# Altium schematic symbol library Analog Devices Operational Amplifiers.SchLib: 2102 symbols (part 3 of 35) (continued)
## AD813AR-14-REEL7
designator U?
3 Channel Low Power Operational Amplifier, 100 MHz BW, 250 V/us SR, Industrial, 14-pin SOIC (R-14), Reel; Generic Part Number: AD813; Manufacturer: Analog Devices; PartNumber: AD813AR-14-REEL7; Amplifiers Per Package: 3; Input Bias Current: 500nA; Input Offset Voltage: 2mV; Iq/Amp: 5.5mA; Small Signal Bandwidth: 100MHz; V Span Max: 36V; V Span Min: 2.4V; DatasheetVersion: Rev. B; PackageVersion: 060606-A; PackageReference: R-14; PackageDescription: 14-Pin Standard Small Outline Package, Body 8.65 x 3.9 mm, Pitch 1.27 mm; Supplier 1: Digi-Key; Supplier Part Number 1: AD813AR-14-REEL7-ND; Slew Rate: 250V/us; Mounting Technology: Surface Mount; Code_JEDEC: MS-012-AB; ComponentLink1Description: Manufacturer URL; ComponentLink1URL: http://www.analog.com/en/index.html; ComponentLink2Description: Datasheet; ComponentLink2URL: http://www.analog.com/static/imported-files/data_sheets/AD813.pdf; ComponentLink3Description: Package Specification; ComponentLink3URL: http://www.analog.com/static/imported-files/packages/PKG_PDF/SOIC_Narrow%20(R)/R_14.pdf
footprint ADI-R-14_N (SOIC, 14-Leads, Body 8.65x3.9mm, Pitch 1.27mm, IPC Medium Density)
footprint ADI-R-14_L (SOIC, 14-Leads, Body 8.65x3.9mm, Pitch 1.27mm, IPC High Density)
footprint ADI-R-14_M (SOIC, 14-Leads, Body 8.65x3.9mm, Pitch 1.27mm, IPC Low Density)
pins on every part: 4 VS+ (power), 11 VS- (power)
part A pins: 1 ~{DISABLE1} (in), 5 +IN 1 (in), 6 -IN 1 (in), 7 OUT 1 (hiz)
part B pins: 2 ~{DISABLE2} (in), 12 +IN 2 (in), 13 -IN 2 (in), 14 OUT 2 (hiz)
part C pins: 3 ~{DISABLE3} (in), 8 OUT 3 (hiz), 9 -IN 3 (in), 10 +IN 3 (in)

## AD813ARZ-14
designator U?
3 Channel Low Power Operational Amplifier, 100 MHz BW, 250 V/us SR, Industrial, 14-pin SOIC (R-14), Tube; Generic Part Number: AD813; Manufacturer: Analog Devices; PartNumber: AD813ARZ-14; Amplifiers Per Package: 3; Input Bias Current: 500nA; Input Offset Voltage: 2mV; Iq/Amp: 5.5mA; Small Signal Bandwidth: 100MHz; V Span Max: 36V; V Span Min: 2.4V; DatasheetVersion: Rev. B; PackageVersion: 060606-A; PackageReference: R-14; PackageDescription: 14-Pin Standard Small Outline Package, Body 8.65 x 3.9 mm, Pitch 1.27 mm; Supplier 1: Digi-Key; Supplier Part Number 1: AD813ARZ-14-ND; Slew Rate: 250V/us; Mounting Technology: Surface Mount; Code_JEDEC: MS-012-AB; ComponentLink1Description: Manufacturer URL; ComponentLink1URL: http://www.analog.com/en/index.html; ComponentLink2Description: Datasheet; ComponentLink2URL: http://www.analog.com/static/imported-files/data_sheets/AD813.pdf; ComponentLink3Description: Package Specification; ComponentLink3URL: http://www.analog.com/static/imported-files/packages/PKG_PDF/SOIC_Narrow%20(R)/R_14.pdf
footprint ADI-R-14_N (SOIC, 14-Leads, Body 8.65x3.9mm, Pitch 1.27mm, IPC Medium Density)
footprint ADI-R-14_L (SOIC, 14-Leads, Body 8.65x3.9mm, Pitch 1.27mm, IPC High Density)
footprint ADI-R-14_M (SOIC, 14-Leads, Body 8.65x3.9mm, Pitch 1.27mm, IPC Low Density)
pins on every part: 4 VS+ (power), 11 VS- (power)
part A pins: 1 ~{DISABLE1} (in), 5 +IN 1 (in), 6 -IN 1 (in), 7 OUT 1 (hiz)
part B pins: 2 ~{DISABLE2} (in), 12 +IN 2 (in), 13 -IN 2 (in), 14 OUT 2 (hiz)
part C pins: 3 ~{DISABLE3} (in), 8 OUT 3 (hiz), 9 -IN 3 (in), 10 +IN 3 (in)

## AD813ARZ-14-REEL
designator U?
3 Channel Low Power Operational Amplifier, 100 MHz BW, 250 V/us SR, Industrial, 14-pin SOIC (R-14), Reel; Generic Part Number: AD813; Manufacturer: Analog Devices; PartNumber: AD813ARZ-14-REEL; Amplifiers Per Package: 3; Input Bias Current: 500nA; Input Offset Voltage: 2mV; Iq/Amp: 5.5mA; Small Signal Bandwidth: 100MHz; V Span Max: 36V; V Span Min: 2.4V; DatasheetVersion: Rev. B; PackageVersion: 060606-A; PackageReference: R-14; PackageDescription: 14-Pin Standard Small Outline Package, Body 8.65 x 3.9 mm, Pitch 1.27 mm; Supplier 1: Digi-Key; Supplier Part Number 1: AD813ARZ-14-REEL-ND; Slew Rate: 250V/us; Mounting Technology: Surface Mount; Code_JEDEC: MS-012-AB; ComponentLink1Description: Manufacturer URL; ComponentLink1URL: http://www.analog.com/en/index.html; ComponentLink2Description: Datasheet; ComponentLink2URL: http://www.analog.com/static/imported-files/data_sheets/AD813.pdf; ComponentLink3Description: Package Specification; ComponentLink3URL: http://www.analog.com/static/imported-files/packages/PKG_PDF/SOIC_Narrow%20(R)/R_14.pdf
footprint ADI-R-14_N (SOIC, 14-Leads, Body 8.65x3.9mm, Pitch 1.27mm, IPC Medium Density)
footprint ADI-R-14_L (SOIC, 14-Leads, Body 8.65x3.9mm, Pitch 1.27mm, IPC High Density)
footprint ADI-R-14_M (SOIC, 14-Leads, Body 8.65x3.9mm, Pitch 1.27mm, IPC Low Density)
pins on every part: 4 VS+ (power), 11 VS- (power)
part A pins: 1 ~{DISABLE1} (in), 5 +IN 1 (in), 6 -IN 1 (in), 7 OUT 1 (hiz)
part B pins: 2 ~{DISABLE2} (in), 12 +IN 2 (in), 13 -IN 2 (in), 14 OUT 2 (hiz)
part C pins: 3 ~{DISABLE3} (in), 8 OUT 3 (hiz), 9 -IN 3 (in), 10 +IN 3 (in)

## AD813ARZ-14-REEL7
designator U?
3 Channel Low Power Operational Amplifier, 100 MHz BW, 250 V/us SR, Industrial, 14-pin SOIC (R-14), Reel; Generic Part Number: AD813; Manufacturer: Analog Devices; PartNumber: AD813ARZ-14-REEL7; Amplifiers Per Package: 3; Input Bias Current: 500nA; Input Offset Voltage: 2mV; Iq/Amp: 5.5mA; Small Signal Bandwidth: 100MHz; V Span Max: 36V; V Span Min: 2.4V; DatasheetVersion: Rev. B; PackageVersion: 060606-A; PackageReference: R-14; PackageDescription: 14-Pin Standard Small Outline Package, Body 8.65 x 3.9 mm, Pitch 1.27 mm; Supplier 1: Digi-Key; Supplier Part Number 1: AD813ARZ-14-REEL7-ND; Slew Rate: 250V/us; Mounting Technology: Surface Mount; Code_JEDEC: MS-012-AB; ComponentLink1Description: Manufacturer URL; ComponentLink1URL: http://www.analog.com/en/index.html; ComponentLink2Description: Datasheet; ComponentLink2URL: http://www.analog.com/static/imported-files/data_sheets/AD813.pdf; ComponentLink3Description: Package Specification; ComponentLink3URL: http://www.analog.com/static/imported-files/packages/PKG_PDF/SOIC_Narrow%20(R)/R_14.pdf
footprint ADI-R-14_N (SOIC, 14-Leads, Body 8.65x3.9mm, Pitch 1.27mm, IPC Medium Density)
footprint ADI-R-14_L (SOIC, 14-Leads, Body 8.65x3.9mm, Pitch 1.27mm, IPC High Density)
footprint ADI-R-14_M (SOIC, 14-Leads, Body 8.65x3.9mm, Pitch 1.27mm, IPC Low Density)
pins on every part: 4 VS+ (power), 11 VS- (power)
part A pins: 1 ~{DISABLE1} (in), 5 +IN 1 (in), 6 -IN 1 (in), 7 OUT 1 (hiz)
part B pins: 2 ~{DISABLE2} (in), 12 +IN 2 (in), 13 -IN 2 (in), 14 OUT 2 (hiz)
part C pins: 3 ~{DISABLE3} (in), 8 OUT 3 (hiz), 9 -IN 3 (in), 10 +IN 3 (in)

## AD815ARBZ-24
designator U?
Double Channel Low Distortion Operational Amplifier, 120 MHz BW, 900 V/us SR, Industrial, 24-pin SOIC (RB-24), Tube; Generic Part Number: AD815; Manufacturer: Analog Devices; PartNumber: AD815ARBZ-24; Amplifiers Per Package: 2; Input Bias Current: 2uA; Input Offset Voltage: 10mV; Iq/Amp: 40mA; Small Signal Bandwidth: 120MHz; V Span Max: 36V; V Span Min: 10V; DatasheetVersion: Rev. C; PackageReference: RB-24; PackageDescription: 24-Pin Batwing SOIC, Thermally Enhanced with Fused Leads, Body 15.4 x 7.5 mm, Pitch 1.27 mm; Slew Rate: 900V/us; Mounting Technology: Surface Mount; Code_JEDEC: MS-013-AD; ComponentLink1Description: Manufacturer URL; ComponentLink1URL: http://www.analog.com/en/index.html; ComponentLink2Description: Datasheet; ComponentLink2URL: http://www.analog.com/static/imported-files/data_sheets/AD815.pdf; ComponentLink3Description: Package Specification; ComponentLink3URL: http://www.analog.com/static/imported-files/packages/479743993852630252966076RB_24.pdf
footprint ADI-RB-24_N (SOIC, 24-Leads, Body 15.4x7.5mm, Pitch 1.27mm, IPC Medium Density)
footprint ADI-RB-24_L (SOIC, 24-Leads, Body 15.4x7.5mm, Pitch 1.27mm, IPC High Density)
footprint ADI-RB-24_M (SOIC, 24-Leads, Body 15.4x7.5mm, Pitch 1.27mm, IPC Low Density)
part A pins: 9 +IN 1 (in), 10 -IN 1 (in), 11 OUT 1 (out)
part B pins: 14 OUT 2 (out), 15 -IN 2 (in), 16 +IN 2 (in)
part C pins: 1 NC "NO CONNECT", 2 NC "NO CONNECT", 3 NC "NO CONNECT", 4 NC "NO CONNECT", 5 EP (power) "HEAT TABS ARE CONNECTED TO THE POSITIVE SUPPLY.", 6 EP (power) "HEAT TABS ARE CONNECTED TO THE POSITIVE SUPPLY.", 7 EP (power) "HEAT TABS ARE CONNECTED TO THE POSITIVE SUPPLY.", 8 EP (power) "HEAT TABS ARE CONNECTED TO THE POSITIVE SUPPLY.", 12 -VS (power), 13 +VS (power), 17 EP (power) "HEAT TABS ARE CONNECTED TO THE POSITIVE SUPPLY.", 18 EP (power) "HEAT TABS ARE CONNECTED TO THE POSITIVE SUPPLY.", 19 EP (power) "HEAT TABS ARE CONNECTED TO THE POSITIVE SUPPLY.", 20 EP (power) "HEAT TABS ARE CONNECTED TO THE POSITIVE SUPPLY.", 21 NC "NO CONNECT", 22 NC "NO CONNECT", 23 NC "NO CONNECT", 24 NC "NO CONNECT"

## AD815ARBZ-24-REEL
designator U?
Double Channel Low Distortion Operational Amplifier, 120 MHz BW, 900 V/us SR, Industrial, 24-pin SOIC (RB-24), Reel; Generic Part Number: AD815; Manufacturer: Analog Devices; PartNumber: AD815ARBZ-24-REEL; Amplifiers Per Package: 2; Input Bias Current: 2uA; Input Offset Voltage: 10mV; Iq/Amp: 40mA; Small Signal Bandwidth: 120MHz; V Span Max: 36V; V Span Min: 10V; DatasheetVersion: Rev. C; PackageReference: RB-24; PackageDescription: 24-Pin Batwing SOIC, Thermally Enhanced with Fused Leads, Body 15.4 x 7.5 mm, Pitch 1.27 mm; Slew Rate: 900V/us; Mounting Technology: Surface Mount; Code_JEDEC: MS-013-AD; ComponentLink1Description: Manufacturer URL; ComponentLink1URL: http://www.analog.com/en/index.html; ComponentLink2Description: Datasheet; ComponentLink2URL: http://www.analog.com/static/imported-files/data_sheets/AD815.pdf; ComponentLink3Description: Package Specification; ComponentLink3URL: http://www.analog.com/static/imported-files/packages/479743993852630252966076RB_24.pdf
footprint ADI-RB-24_N (SOIC, 24-Leads, Body 15.4x7.5mm, Pitch 1.27mm, IPC Medium Density)
footprint ADI-RB-24_L (SOIC, 24-Leads, Body 15.4x7.5mm, Pitch 1.27mm, IPC High Density)
footprint ADI-RB-24_M (SOIC, 24-Leads, Body 15.4x7.5mm, Pitch 1.27mm, IPC Low Density)
part A pins: 9 +IN 1 (in), 10 -IN 1 (in), 11 OUT 1 (out)
part B pins: 14 OUT 2 (out), 15 -IN 2 (in), 16 +IN 2 (in)
part C pins: 1 NC "NO CONNECT", 2 NC "NO CONNECT", 3 NC "NO CONNECT", 4 NC "NO CONNECT", 5 EP (power) "HEAT TABS ARE CONNECTED TO THE POSITIVE SUPPLY.", 6 EP (power) "HEAT TABS ARE CONNECTED TO THE POSITIVE SUPPLY.", 7 EP (power) "HEAT TABS ARE CONNECTED TO THE POSITIVE SUPPLY.", 8 EP (power) "HEAT TABS ARE CONNECTED TO THE POSITIVE SUPPLY.", 12 -VS (power), 13 +VS (power), 17 EP (power) "HEAT TABS ARE CONNECTED TO THE POSITIVE SUPPLY.", 18 EP (power) "HEAT TABS ARE CONNECTED TO THE POSITIVE SUPPLY.", 19 EP (power) "HEAT TABS ARE CONNECTED TO THE POSITIVE SUPPLY.", 20 EP (power) "HEAT TABS ARE CONNECTED TO THE POSITIVE SUPPLY.", 21 NC "NO CONNECT", 22 NC "NO CONNECT", 23 NC "NO CONNECT", 24 NC "NO CONNECT"

## AD817AN
designator U?
Single Channel Low Power Operational Amplifier, 50 MHz BW, 350 V/us SR, Industrial, 8-pin DIP (N-8), Tube; Generic Part Number: AD817; Manufacturer: Analog Devices; PartNumber: AD817AN; Amplifiers Per Package: 1; Input Bias Current: 3.3uA; Input Offset Voltage: 500uV; Iq/Amp: 7.5mA; Small Signal Bandwidth: 50MHz; V Span Max: 36V; V Span Min: 5V; DatasheetVersion: Rev. B; PackageVersion: 070606-A; PackageReference: N-8; PackageDescription: 8-Pin Plastic Dual In-Line Package, Row spacing 7.62 mm, Pitch 2.54 mm; Supplier 1: Digi-Key; Supplier Part Number 1: AD817AN-ND; Slew Rate: 350V/us; Mounting Technology: Through Hole; Code_JEDEC: MS-001; ComponentLink1Description: Manufacturer URL; ComponentLink1URL: http://www.analog.com/en/index.html; ComponentLink2Description: Datasheet; ComponentLink2URL: http://www.analog.com/static/imported-files/data_sheets/AD817.pdf; ComponentLink3Description: Package Specification; ComponentLink3URL: http:/www.analog.com/static/imported-files/packages/PKG_PDF/PDIP(N)/N_8.pdf
footprint ADI-N-8 (DIP, 8-Leads, Body 9.59x6.6mm, Pitch 2.54mm)
pins: 1 NULL (in), 2 -IN (in), 3 +IN (in), 4 -VS (power), 5 NC, 6 OUT (out), 7 +VS (power), 8 NULL (in)

## AD817ANZ
designator U?
Single Channel Low Power Operational Amplifier, 50 MHz BW, 350 V/us SR, Industrial, 8-pin DIP (N-8), Tube; Generic Part Number: AD817; Manufacturer: Analog Devices; PartNumber: AD817ANZ; Amplifiers Per Package: 1; Input Bias Current: 3.3uA; Input Offset Voltage: 500uV; Iq/Amp: 7.5mA; Small Signal Bandwidth: 50MHz; V Span Max: 36V; V Span Min: 5V; DatasheetVersion: Rev. B; PackageVersion: 070606-A; PackageReference: N-8; PackageDescription: 8-Pin Plastic Dual In-Line Package, Row spacing 7.62 mm, Pitch 2.54 mm; Supplier 1: Digi-Key; Supplier Part Number 1: AD817ANZ-ND; Supplier 2: Farnell; Supplier Part Number 2: 9604006; Supplier 3: Newark; Supplier Part Number 3: 59K6447; Slew Rate: 350V/us; Mounting Technology: Through Hole; Code_JEDEC: MS-001; ComponentLink1Description: Manufacturer URL; ComponentLink1URL: http://www.analog.com/en/index.html; ComponentLink2Description: Datasheet; ComponentLink2URL: http://www.analog.com/static/imported-files/data_sheets/AD817.pdf; ComponentLink3Description: Package Specification; ComponentLink3URL: http:/www.analog.com/static/imported-files/packages/PKG_PDF/PDIP(N)/N_8.pdf
footprint ADI-N-8 (DIP, 8-Leads, Body 9.59x6.6mm, Pitch 2.54mm)
pins: 1 NULL (in), 2 -IN (in), 3 +IN (in), 4 -VS (power), 5 NC, 6 OUT (out), 7 +VS (power), 8 NULL (in)

## AD817AR
designator U?
Single Channel Low Power Operational Amplifier, 50 MHz BW, 350 V/us SR, Industrial, 8-pin SOIC (R-8), Tube; Generic Part Number: AD817; Manufacturer: Analog Devices; PartNumber: AD817AR; Amplifiers Per Package: 1; Input Bias Current: 3.3uA; Input Offset Voltage: 500uV; Iq/Amp: 7.5mA; Small Signal Bandwidth: 50MHz; V Span Max: 36V; V Span Min: 5V; DatasheetVersion: Rev. B; PackageVersion: 060506-A; PackageReference: R-8; PackageDescription: 8-Pin Standard Small Outline Package, Body 3.9 x 4.9 mm, Pitch 1.27 mm; Supplier 1: Digi-Key; Supplier Part Number 1: AD817AR-ND; Slew Rate: 350V/us; Mounting Technology: Surface Mount; Code_JEDEC: MS-012-AA; ComponentLink1Description: Manufacturer URL; ComponentLink1URL: http://www.analog.com/en/index.html; ComponentLink2Description: Datasheet; ComponentLink2URL: http://www.analog.com/static/imported-files/data_sheets/AD817.pdf; ComponentLink3Description: Package Specification; ComponentLink3URL: http://www.analog.com/static/imported-files/packages/PKG_PDF/SOIC_Narrow%20(R)/R_8.pdf
footprint ADI-R-8_N (SOIC, 8-Leads, Body 4.9x3.9mm, Pitch 1.27mm, IPC Medium Density)
footprint ADI-R-8_L (SOIC, 8-Leads, Body 4.9x3.9mm, Pitch 1.27mm, IPC High Density)
footprint ADI-R-8_M (SOIC, 8-Leads, Body 4.9x3.9mm, Pitch 1.27mm, IPC Low Density)
pins: 1 NULL (in), 2 -IN (in), 3 +IN (in), 4 -VS (power), 5 NC, 6 OUT (out), 7 +VS (power), 8 NULL (in)

## AD817AR-REEL
designator U?
Single Channel Low Power Operational Amplifier, 50 MHz BW, 350 V/us SR, Industrial, 8-pin SOIC (R-8), Reel; Generic Part Number: AD817; Manufacturer: Analog Devices; PartNumber: AD817AR-REEL; Amplifiers Per Package: 1; Input Bias Current: 3.3uA; Input Offset Voltage: 500uV; Iq/Amp: 7.5mA; Small Signal Bandwidth: 50MHz; V Span Max: 36V; V Span Min: 5V; DatasheetVersion: Rev. B; PackageVersion: 060506-A; PackageReference: R-8; PackageDescription: 8-Pin Standard Small Outline Package, Body 3.9 x 4.9 mm, Pitch 1.27 mm; Supplier 1: Digi-Key; Supplier Part Number 1: AD817AR-REEL-ND; Supplier 2: Newark; Supplier Part Number 2: 09B6481; Slew Rate: 350V/us; Mounting Technology: Surface Mount; Code_JEDEC: MS-012-AA; ComponentLink1Description: Manufacturer URL; ComponentLink1URL: http://www.analog.com/en/index.html; ComponentLink2Description: Datasheet; ComponentLink2URL: http://www.analog.com/static/imported-files/data_sheets/AD817.pdf; ComponentLink3Description: Package Specification; ComponentLink3URL: http://www.analog.com/static/imported-files/packages/PKG_PDF/SOIC_Narrow%20(R)/R_8.pdf
footprint ADI-R-8_N (SOIC, 8-Leads, Body 4.9x3.9mm, Pitch 1.27mm, IPC Medium Density)
footprint ADI-R-8_L (SOIC, 8-Leads, Body 4.9x3.9mm, Pitch 1.27mm, IPC High Density)
footprint ADI-R-8_M (SOIC, 8-Leads, Body 4.9x3.9mm, Pitch 1.27mm, IPC Low Density)
pins: 1 NULL (in), 2 -IN (in), 3 +IN (in), 4 -VS (power), 5 NC, 6 OUT (out), 7 +VS (power), 8 NULL (in)

## AD817AR-REEL7
designator U?
Single Channel Low Power Operational Amplifier, 50 MHz BW, 350 V/us SR, Industrial, 8-pin SOIC (R-8), Reel; Generic Part Number: AD817; Manufacturer: Analog Devices; PartNumber: AD817AR-REEL7; Amplifiers Per Package: 1; Input Bias Current: 3.3uA; Input Offset Voltage: 500uV; Iq/Amp: 7.5mA; Small Signal Bandwidth: 50MHz; V Span Max: 36V; V Span Min: 5V; DatasheetVersion: Rev. B; PackageVersion: 060506-A; PackageReference: R-8; PackageDescription: 8-Pin Standard Small Outline Package, Body 3.9 x 4.9 mm, Pitch 1.27 mm; Supplier 1: Digi-Key; Supplier Part Number 1: AD817AR-REEL7-ND; Supplier 2: Newark; Supplier Part Number 2: 09B6482; Slew Rate: 350V/us; Mounting Technology: Surface Mount; Code_JEDEC: MS-012-AA; ComponentLink1Description: Manufacturer URL; ComponentLink1URL: http://www.analog.com/en/index.html; ComponentLink2Description: Datasheet; ComponentLink2URL: http://www.analog.com/static/imported-files/data_sheets/AD817.pdf; ComponentLink3Description: Package Specification; ComponentLink3URL: http://www.analog.com/static/imported-files/packages/PKG_PDF/SOIC_Narrow%20(R)/R_8.pdf
footprint ADI-R-8_N (SOIC, 8-Leads, Body 4.9x3.9mm, Pitch 1.27mm, IPC Medium Density)
footprint ADI-R-8_L (SOIC, 8-Leads, Body 4.9x3.9mm, Pitch 1.27mm, IPC High Density)
footprint ADI-R-8_M (SOIC, 8-Leads, Body 4.9x3.9mm, Pitch 1.27mm, IPC Low Density)
pins: 1 NULL (in), 2 -IN (in), 3 +IN (in), 4 -VS (power), 5 NC, 6 OUT (out), 7 +VS (power), 8 NULL (in)

## AD817ARZ
designator U?
Single Channel Low Power Operational Amplifier, 50 MHz BW, 350 V/us SR, Industrial, 8-pin SOIC (R-8), Tube; Generic Part Number: AD817; Manufacturer: Analog Devices; PartNumber: AD817ARZ; Amplifiers Per Package: 1; Input Bias Current: 3.3uA; Input Offset Voltage: 500uV; Iq/Amp: 7.5mA; Small Signal Bandwidth: 50MHz; V Span Max: 36V; V Span Min: 5V; DatasheetVersion: Rev. B; PackageVersion: 060506-A; PackageReference: R-8; PackageDescription: 8-Pin Standard Small Outline Package, Body 3.9 x 4.9 mm, Pitch 1.27 mm; Supplier 1: Digi-Key; Supplier Part Number 1: AD817ARZ-ND; Supplier 2: Farnell; Supplier Part Number 2: 1660992; Supplier 3: Newark; Supplier Part Number 3: 88H0179; Slew Rate: 350V/us; Mounting Technology: Surface Mount; Code_JEDEC: MS-012-AA; ComponentLink1Description: Manufacturer URL; ComponentLink1URL: http://www.analog.com/en/index.html; ComponentLink2Description: Datasheet; ComponentLink2URL: http://www.analog.com/static/imported-files/data_sheets/AD817.pdf; ComponentLink3Description: Package Specification; ComponentLink3URL: http://www.analog.com/static/imported-files/packages/PKG_PDF/SOIC_Narrow%20(R)/R_8.pdf
footprint ADI-R-8_N (SOIC, 8-Leads, Body 4.9x3.9mm, Pitch 1.27mm, IPC Medium Density)
footprint ADI-R-8_L (SOIC, 8-Leads, Body 4.9x3.9mm, Pitch 1.27mm, IPC High Density)
footprint ADI-R-8_M (SOIC, 8-Leads, Body 4.9x3.9mm, Pitch 1.27mm, IPC Low Density)
pins: 1 NULL (in), 2 -IN (in), 3 +IN (in), 4 -VS (power), 5 NC, 6 OUT (out), 7 +VS (power), 8 NULL (in)

## AD817ARZ-REEL
designator U?
Single Channel Low Power Operational Amplifier, 50 MHz BW, 350 V/us SR, Industrial, 8-pin SOIC (R-8), Reel; Generic Part Number: AD817; Manufacturer: Analog Devices; PartNumber: AD817ARZ-REEL; Amplifiers Per Package: 1; Input Bias Current: 3.3uA; Input Offset Voltage: 500uV; Iq/Amp: 7.5mA; Small Signal Bandwidth: 50MHz; V Span Max: 36V; V Span Min: 5V; DatasheetVersion: Rev. B; PackageVersion: 060506-A; PackageReference: R-8; PackageDescription: 8-Pin Standard Small Outline Package, Body 3.9 x 4.9 mm, Pitch 1.27 mm; Supplier 1: Digi-Key; Supplier Part Number 1: AD817ARZ-REELTR-ND; Supplier 2: Digi-Key; Supplier Part Number 2: AD817ARZ-REELCT-ND; Supplier 3: Digi-Key; Supplier Part Number 3: AD817ARZ-REELDKR-ND; Supplier 4: Newark; Supplier Part Number 4: 88H0180; Slew Rate: 350V/us; Mounting Technology: Surface Mount; Code_JEDEC: MS-012-AA; ComponentLink1Description: Manufacturer URL; ComponentLink1URL: http://www.analog.com/en/index.html; ComponentLink2Description: Datasheet; ComponentLink2URL: http://www.analog.com/static/imported-files/data_sheets/AD817.pdf; ComponentLink3Description: Package Specification; ComponentLink3URL: http://www.analog.com/static/imported-files/packages/PKG_PDF/SOIC_Narrow%20(R)/R_8.pdf
footprint ADI-R-8_N (SOIC, 8-Leads, Body 4.9x3.9mm, Pitch 1.27mm, IPC Medium Density)
footprint ADI-R-8_L (SOIC, 8-Leads, Body 4.9x3.9mm, Pitch 1.27mm, IPC High Density)
footprint ADI-R-8_M (SOIC, 8-Leads, Body 4.9x3.9mm, Pitch 1.27mm, IPC Low Density)
pins: 1 NULL (in), 2 -IN (in), 3 +IN (in), 4 -VS (power), 5 NC, 6 OUT (out), 7 +VS (power), 8 NULL (in)

## AD817ARZ-REEL7
designator U?
Single Channel Low Power Operational Amplifier, 50 MHz BW, 350 V/us SR, Industrial, 8-pin SOIC (R-8), Reel; Generic Part Number: AD817; Manufacturer: Analog Devices; PartNumber: AD817ARZ-REEL7; Amplifiers Per Package: 1; Input Bias Current: 3.3uA; Input Offset Voltage: 500uV; Iq/Amp: 7.5mA; Small Signal Bandwidth: 50MHz; V Span Max: 36V; V Span Min: 5V; DatasheetVersion: Rev. B; PackageVersion: 060506-A; PackageReference: R-8; PackageDescription: 8-Pin Standard Small Outline Package, Body 3.9 x 4.9 mm, Pitch 1.27 mm; Supplier 1: Digi-Key; Supplier Part Number 1: AD817ARZ-REEL7-ND; Supplier 2: Newark; Supplier Part Number 2: 82H2987; Slew Rate: 350V/us; Mounting Technology: Surface Mount; Code_JEDEC: MS-012-AA; ComponentLink1Description: Manufacturer URL; ComponentLink1URL: http://www.analog.com/en/index.html; ComponentLink2Description: Datasheet; ComponentLink2URL: http://www.analog.com/static/imported-files/data_sheets/AD817.pdf; ComponentLink3Description: Package Specification; ComponentLink3URL: http://www.analog.com/static/imported-files/packages/PKG_PDF/SOIC_Narrow%20(R)/R_8.pdf
footprint ADI-R-8_N (SOIC, 8-Leads, Body 4.9x3.9mm, Pitch 1.27mm, IPC Medium Density)
footprint ADI-R-8_L (SOIC, 8-Leads, Body 4.9x3.9mm, Pitch 1.27mm, IPC High Density)
footprint ADI-R-8_M (SOIC, 8-Leads, Body 4.9x3.9mm, Pitch 1.27mm, IPC Low Density)
pins: 1 NULL (in), 2 -IN (in), 3 +IN (in), 4 -VS (power), 5 NC, 6 OUT (out), 7 +VS (power), 8 NULL (in)

## AD818ANZ
designator U?
Single Channel Low Cost Operational Amplifier, 130 MHz BW, 500 V/us SR, Industrial, 8-pin DIP (N-8), Tube; Generic Part Number: AD818; Manufacturer: Analog Devices; PartNumber: AD818ANZ; Amplifiers Per Package: 1; Input Bias Current: 3.3uA; Input Offset Voltage: 500uV; Iq/Amp: 7.5mA; Small Signal Bandwidth: 130MHz; V Span Max: 36V; V Span Min: 5V; DatasheetVersion: Rev. D; PackageVersion: 070606-A; PackageReference: N-8; PackageDescription: 8-Pin Plastic Dual In-Line Package, Row spacing 7.62 mm, Pitch 2.54 mm; Supplier 1: Digi-Key; Supplier Part Number 1: AD818ANZ-ND; Supplier 2: Farnell; Supplier Part Number 2: 9605630; Supplier 3: Newark; Supplier Part Number 3: 19M0940; Slew Rate: 500V/us; Mounting Technology: Through Hole; Code_JEDEC: MS-001; ComponentLink1Description: Manufacturer URL; ComponentLink1URL: http://www.analog.com/en/index.html; ComponentLink2Description: Datasheet; ComponentLink2URL: http://www.analog.com/static/imported-files/data_sheets/AD818.pdf; ComponentLink3Description: Package Specification; ComponentLink3URL: http:/www.analog.com/static/imported-files/packages/PKG_PDF/PDIP(N)/N_8.pdf
footprint ADI-N-8 (DIP, 8-Leads, Body 9.59x6.6mm, Pitch 2.54mm)
pins: 1 NULL (in), 2 -IN (in), 3 +IN (in), 4 -VS (power), 5 NC, 6 OUT (out), 7 +VS (power), 8 NULL (in)

## AD818AR
designator U?
Single Channel Low Cost Operational Amplifier, 130 MHz BW, 500 V/us SR, Industrial, 8-pin SOIC (R-8), Tube; Generic Part Number: AD818; Manufacturer: Analog Devices; PartNumber: AD818AR; Amplifiers Per Package: 1; Input Bias Current: 3.3uA; Input Offset Voltage: 500uV; Iq/Amp: 7.5mA; Small Signal Bandwidth: 130MHz; V Span Max: 36V; V Span Min: 5V; DatasheetVersion: Rev. D; PackageVersion: 060506-A; PackageReference: R-8; PackageDescription: 8-Pin Standard Small Outline Package, Body 3.9 x 4.9 mm, Pitch 1.27 mm; Supplier 1: Digi-Key; Supplier Part Number 1: AD818AR-ND; Slew Rate: 500V/us; Mounting Technology: Surface Mount; Code_JEDEC: MS-012-AA; ComponentLink1Description: Manufacturer URL; ComponentLink1URL: http://www.analog.com/en/index.html; ComponentLink2Description: Datasheet; ComponentLink2URL: http://www.analog.com/static/imported-files/data_sheets/AD818.pdf; ComponentLink3Description: Package Specification; ComponentLink3URL: http://www.analog.com/static/imported-files/packages/PKG_PDF/SOIC_Narrow%20(R)/R_8.pdf
footprint ADI-R-8_N (SOIC, 8-Leads, Body 4.9x3.9mm, Pitch 1.27mm, IPC Medium Density)
footprint ADI-R-8_L (SOIC, 8-Leads, Body 4.9x3.9mm, Pitch 1.27mm, IPC High Density)
footprint ADI-R-8_M (SOIC, 8-Leads, Body 4.9x3.9mm, Pitch 1.27mm, IPC Low Density)
pins: 1 NULL (in), 2 -IN (in), 3 +IN (in), 4 -VS (power), 5 NC, 6 OUT (out), 7 +VS (power), 8 NULL (in)

## AD818AR-REEL7
designator U?
Single Channel Low Cost Operational Amplifier, 130 MHz BW, 500 V/us SR, Industrial, 8-pin SOIC (R-8), Reel; Generic Part Number: AD818; Manufacturer: Analog Devices; PartNumber: AD818AR-REEL7; Amplifiers Per Package: 1; Input Bias Current: 3.3uA; Input Offset Voltage: 500uV; Iq/Amp: 7.5mA; Small Signal Bandwidth: 130MHz; V Span Max: 36V; V Span Min: 5V; DatasheetVersion: Rev. D; PackageVersion: 060506-A; PackageReference: R-8; PackageDescription: 8-Pin Standard Small Outline Package, Body 3.9 x 4.9 mm, Pitch 1.27 mm; Supplier 1: Digi-Key; Supplier Part Number 1: AD818AR-REEL7-ND; Supplier 2: Newark; Supplier Part Number 2: 09B6496; Slew Rate: 500V/us; Mounting Technology: Surface Mount; Code_JEDEC: MS-012-AA; ComponentLink1Description: Manufacturer URL; ComponentLink1URL: http://www.analog.com/en/index.html; ComponentLink2Description: Datasheet; ComponentLink2URL: http://www.analog.com/static/imported-files/data_sheets/AD818.pdf; ComponentLink3Description: Package Specification; ComponentLink3URL: http://www.analog.com/static/imported-files/packages/PKG_PDF/SOIC_Narrow%20(R)/R_8.pdf
footprint ADI-R-8_N (SOIC, 8-Leads, Body 4.9x3.9mm, Pitch 1.27mm, IPC Medium Density)
footprint ADI-R-8_L (SOIC, 8-Leads, Body 4.9x3.9mm, Pitch 1.27mm, IPC High Density)
footprint ADI-R-8_M (SOIC, 8-Leads, Body 4.9x3.9mm, Pitch 1.27mm, IPC Low Density)
pins: 1 NULL (in), 2 -IN (in), 3 +IN (in), 4 -VS (power), 5 NC, 6 OUT (out), 7 +VS (power), 8 NULL (in)

## AD818ARZ
designator U?
Single Channel Low Cost Operational Amplifier, 130 MHz BW, 500 V/us SR, Industrial, 8-pin SOIC (R-8), Tube; Generic Part Number: AD818; Manufacturer: Analog Devices; PartNumber: AD818ARZ; Amplifiers Per Package: 1; Input Bias Current: 3.3uA; Input Offset Voltage: 500uV; Iq/Amp: 7.5mA; Small Signal Bandwidth: 130MHz; V Span Max: 36V; V Span Min: 5V; DatasheetVersion: Rev. D; PackageVersion: 060506-A; PackageReference: R-8; PackageDescription: 8-Pin Standard Small Outline Package, Body 3.9 x 4.9 mm, Pitch 1.27 mm; Supplier 1: Digi-Key; Supplier Part Number 1: AD818ARZ-ND; Supplier 2: Newark; Supplier Part Number 2: 82H2988; Slew Rate: 500V/us; Mounting Technology: Surface Mount; Code_JEDEC: MS-012-AA; ComponentLink1Description: Manufacturer URL; ComponentLink1URL: http://www.analog.com/en/index.html; ComponentLink2Description: Datasheet; ComponentLink2URL: http://www.analog.com/static/imported-files/data_sheets/AD818.pdf; ComponentLink3Description: Package Specification; ComponentLink3URL: http://www.analog.com/static/imported-files/packages/PKG_PDF/SOIC_Narrow%20(R)/R_8.pdf
footprint ADI-R-8_N (SOIC, 8-Leads, Body 4.9x3.9mm, Pitch 1.27mm, IPC Medium Density)
footprint ADI-R-8_L (SOIC, 8-Leads, Body 4.9x3.9mm, Pitch 1.27mm, IPC High Density)
footprint ADI-R-8_M (SOIC, 8-Leads, Body 4.9x3.9mm, Pitch 1.27mm, IPC Low Density)
pins: 1 NULL (in), 2 -IN (in), 3 +IN (in), 4 -VS (power), 5 NC, 6 OUT (out), 7 +VS (power), 8 NULL (in)
